# Altium footprint library PcbLib_ICs.PcbLib: 317 footprints (part 7 of 24) (continued)
## H02.8-1B [mm] (continued)
  text ".Designator" at -3.443,-0.467 h2
Top Text:
  lines w0.1: -0.5,0 0.5,0 ; 0,-0.5 0,0.5
3D body "User Library-H02_8-1B1.STEP": height 3.03, standoff -0.02, extent -4.5,-3.25 5,3.25

## H02.8-1B(with SO-8) [mm]
pads (18):
  rect 2.5x0.5 smd paste+0 mask+0.05: 1(-3.75,2) 2(-3.75,1) 3(-3.75,-1) 4(-3.75,-2) 5(3.75,-2) 6(3.75,-1) 7(3.75,1) 8(3.75,2) 9(-3.75,0) 10(3.75,0)
  rect 0.6x1.45 smd paste+0 mask+0.05: 1(1.905,2.725)
  oval 0.6x1.45 smd paste+0 mask+0.05: 2(0.635,2.725) 3(-0.635,2.725) 4(-1.905,2.725) 5(-1.905,-2.725) 6(-0.635,-2.725) 7(0.635,-2.725) 8(1.905,-2.725)
Top Overlay:
  circle w0.25: c-4.275,2.9 r0.125
  lines w0.2: -3.379,-3.372 -3.379,-2.625 ; -3.377,-3.372 -2.503,-3.372 ; -3.377,2.625 -3.377,3.372 -2.503,3.372 ; -1.375,3.375 -1.175,3.375 ; -1.365,-3.375 -1.165,-3.375 ; -0.105,3.375 0.095,3.375 ; -0.095,-3.375 0.105,-3.375 ; 1.165,3.375 1.365,3.375 ; 1.175,-3.375 1.375,-3.375 ; 2.503,-3.372 3.377,-3.372 3.377,-2.625 ; 2.503,3.372 3.377,3.372 ; 3.379,2.625 3.379,3.372
Top Simple Assy:
  circle w0.4: c-4.3,2.9 r0.05
Top Assy:
  circle w0.05: c1.784,1.225 r0.216
  lines w0.05: -2.451,-1.867 -2.451,1.867 ; -2.451,-1.867 -2.266,-1.682 ; -2.451,-1.867 2.451,-1.867 ; -2.451,-1.867 -2.451,1.867 ; -2.451,-1.867 -2.121,-1.867 ; -2.451,1.867 -2.266,1.682 ; -2.451,1.867 2.451,1.867 ; -2.451,1.867 -2.121,1.867 ; -2.266,-1.682 -2.266,1.682 ; -2.266,-1.682 2.266,-1.682 ; -2.266,1.682 2.266,1.682 ; -2.121,-2.889 -2.121,-2.502 ; -2.121,-2.889 -1.715,-2.889 ; -2.121,-2.889 -2.121,-1.867 ; -2.121,-2.889 -1.715,-2.889 ; -2.121,-2.502 -1.715,-2.502 ; -2.121,-2.502 -2.121,-2.261 ; -2.121,-2.261 -2.121,-2.019 ; -2.121,-2.261 -1.715,-2.261 ; -2.121,-2.019 -1.715,-2.019 ; -2.121,-2.019 -2.121,-1.867 ; -2.121,1.867 -2.121,2.019 ; -2.121,1.867 -2.121,2.889 ; -2.121,2.019 -1.715,2.019 ; -2.121,2.019 -2.121,2.261 ; -2.121,2.261 -2.121,2.502 ; -2.121,2.261 -1.715,2.261 ; -2.121,2.502 -1.715,2.502 ; -2.121,2.502 -2.121,2.889 ; -2.121,2.889 -1.715,2.889 ; -2.121,2.889 -1.715,2.889 ; -1.715,-2.889 -1.715,-2.502 ; -1.715,-2.889 -1.715,-1.867 ; -1.715,-2.502 -1.715,-2.261 ; -1.715,-2.261 -1.715,-2.019 ; -1.715,-2.019 -1.715,-1.867 ; -1.715,-1.867 -0.851,-1.867 ; -1.715,1.867 -1.715,2.019 ; -1.715,1.867 -0.851,1.867 ; -1.715,1.867 -1.715,2.889 ; -1.715,2.019 -1.715,2.261 ; -1.715,2.261 -1.715,2.502 ; -1.715,2.502 -1.715,2.889 ; -0.851,-2.889 -0.851,-2.502 ; -0.851,-2.889 -0.445,-2.889 ; -0.851,-2.889 -0.445,-2.889 ; -0.851,-2.889 -0.851,-1.867 ; -0.851,-2.502 -0.445,-2.502 ; -0.851,-2.502 -0.851,-2.261 ; -0.851,-2.261 -0.851,-2.019 ; -0.851,-2.261 -0.445,-2.261 ; -0.851,-2.019 -0.445,-2.019 ; -0.851,-2.019 -0.851,-1.867 ; -0.851,1.867 -0.851,2.019 ; -0.851,1.867 -0.851,2.889 ; -0.851,2.019 -0.445,2.019 ; -0.851,2.019 -0.851,2.261 ; -0.851,2.261 -0.851,2.502 ; -0.851,2.261 -0.445,2.261 ; -0.851,2.502 -0.445,2.502 ; -0.851,2.502 -0.851,2.889 ; -0.851,2.889 -0.445,2.889 ; -0.851,2.889 -0.445,2.889 ; -0.445,-2.889 -0.445,-2.502 ; -0.445,-2.889 -0.445,-1.867 ; -0.445,-2.502 -0.445,-2.261 ; -0.445,-2.261 -0.445,-2.019 ; -0.445,-2.019 -0.445,-1.867 ; -0.445,-1.867 0.419,-1.867 ; -0.445,1.867 -0.445,2.019 ; -0.445,1.867 0.419,1.867 ; -0.445,1.867 -0.445,2.889 ; -0.445,2.019 -0.445,2.261 ; -0.445,2.261 -0.445,2.502 ; -0.445,2.502 -0.445,2.889 ; 0.419,-2.889 0.419,-2.502 ; 0.419,-2.889 0.825,-2.889 ; 0.419,-2.889 0.419,-1.867 ; 0.419,-2.889 0.825,-2.889 ; 0.419,-2.502 0.825,-2.502 ; 0.419,-2.502 0.419,-2.261 ; 0.419,-2.261 0.419,-2.019 ; 0.419,-2.261 0.826,-2.261 ; 0.419,-2.019 0.826,-2.019 ; 0.419,-2.019 0.419,-1.867 ; 0.419,1.867 0.419,2.019 ; 0.419,1.867 0.419,2.889 ; 0.419,2.019 0.825,2.019 ; 0.419,2.019 0.419,2.261 ; 0.419,2.261 0.419,2.502 ; 0.419,2.261 0.826,2.261 ; 0.419,2.502 0.825,2.502 ; 0.419,2.502 0.419,2.889 ; 0.419,2.889 0.826,2.889 ; 0.419,2.889 0.826,2.889 ; 0.825,-2.889 0.825,-2.502 ; 0.825,-2.889 0.825,-1.867 ; 0.825,-2.502 0.826,-2.261 ; 0.826,-2.261 0.826,-2.019 ; 0.826,-2.019 0.825,-1.867 ; 0.825,-1.867 1.689,-1.867 ; 0.825,1.867 0.825,2.019 ; 0.825,1.867 1.689,1.867 ; 0.825,1.867 0.826,2.889 ; 0.825,2.019 0.826,2.261 ; 0.826,2.261 0.825,2.502 ; 0.825,2.502 0.826,2.889 ; 1.689,-2.889 1.689,-2.502 ; 1.689,-2.889 2.095,-2.889 ; 1.689,-2.889 2.095,-2.889 ; 1.689,-2.889 1.689,-1.867 ; 1.689,-2.502 2.095,-2.502 ; 1.689,-2.502 1.689,-2.261 ; 1.689,-2.261 1.689,-2.019 ; 1.689,-2.261 2.095,-2.261 ; 1.689,-2.019 2.095,-2.019 ; 1.689,-2.019 1.689,-1.867 ; 1.689,1.867 1.689,2.019 ; 1.689,1.867 1.689,2.889 ; 1.689,2.019 2.095,2.019 ; 1.689,2.019 1.689,2.261 ; 1.689,2.261 1.689,2.502 ; 1.689,2.261 2.095,2.261 ; 1.689,2.502 2.095,2.502 ; 1.689,2.502 1.689,2.889 ; 1.689,2.889 2.095,2.889 ; 1.689,2.889 2.095,2.889 ; 2.095,-2.889 2.095,-2.502 ; 2.095,-2.889 2.095,-1.867 ; 2.095,-2.502 2.095,-2.261 ; 2.095,-2.261 2.095,-2.019 ; 2.095,-2.019 2.095,-1.867 ; 2.095,-1.867 2.451,-1.867 ; 2.095,1.867 2.095,2.019 ; 2.095,1.867 2.451,1.867 ; 2.095,1.867 2.095,2.889 ; 2.095,2.019 2.095,2.261 ; 2.095,2.261 2.095,2.502 ; 2.095,2.502 2.095,2.889 ; 2.266,-1.682 2.266,1.682 ; 2.266,-1.682 2.451,-1.867 ; 2.266,1.682 2.451,1.867 ; 2.451,-1.867 2.451,1.867 ; 2.451,-1.867 2.451,1.867
  text ".Designator" at -3.443,-0.467 h2
Top Text:
  lines w0.1: -0.5,0 0.5,0 ; 0,-0.5 0,0.5
3D body "User Library-H02_8-1B1.STEP": height 3.03, standoff -0.02, extent -4.75,-3.25 4.75,3.25

## H04.16-2B [mm]
pads (16):
  rect 0.55x3.3 smd paste+0 mask+0.075: 1(0,0) 8(0,-9.1) 9(1,-9.1) 16(1,0)
  rect 3.3x0.55 smd paste+0 mask+0.075: 2(-3.85,-2.05) 3(-3.85,-3.05) 4(-3.85,-4.05) 5(-3.85,-5.05) 6(-3.85,-6.05) 7(-3.85,-7.05) 10(4.85,-7) 11(4.85,-6) 12(4.85,-5) 13(4.85,-4) 14(4.85,-3) 15(4.85,-2)
Top Overlay:
  circle w0.25: c-0.925,0.4 r0.125
  lines w0.2: -3.325,-7.975 -3.325,-8.575 -2.725,-8.575 ; -3.325,-1.125 -3.325,-0.525 -2.725,-0.525 ; 3.725,-8.575 4.325,-8.575 4.325,-7.975 ; 3.725,-0.525 4.325,-0.525 4.325,-1.125
Top Simple Assy:
  lines w0.05: -3.2,-8.45 -3.2,-0.65 4.2,-0.65 4.2,-8.45 -3.2,-8.45
3D body "�04.16-1� kirra.STEP": height 2.92, standoff 0, extent -7.34,-12.55 8.34,3.45

## H16.48-2B [mm]
pads (48):
  rect 1.6x0.5 smd paste+0 mask+0.075: 1(-7.4,-0.5) 2(-7.4,-1.5) 3(-7.4,-2.5) 4(-7.4,-3.5) 5(-7.4,-4.5) 6(-7.4,-5.5) 19(7.4,-5.5) 20(7.4,-4.5) 21(7.4,-3.5) 22(7.4,-2.5) 23(7.4,-1.5) 24(7.4,-0.5) 25(7.4,0.5) 26(7.4,1.5) 27(7.4,2.5) 28(7.4,3.5) 29(7.4,4.5) 30(7.4,5.5) 43(-7.4,5.5) 44(-7.4,4.5) 45(-7.4,3.5) 46(-7.4,2.5) 47(-7.4,1.5) 48(-7.4,0.5)
  rect 0.5x1.6 smd paste+0 mask+0.075: 7(-5.5,-7.4) 8(-4.5,-7.4) 9(-3.5,-7.4) 10(-2.5,-7.4) 11(-1.5,-7.4) 12(-0.5,-7.4) 13(0.5,-7.4) 14(1.5,-7.4) 15(2.5,-7.4) 16(3.5,-7.4) 17(4.5,-7.4) 18(5.5,-7.4) 31(5.5,7.4) 32(4.5,7.4) 33(3.5,7.4) 34(2.5,7.4) 35(1.5,7.4) 36(0.5,7.4) 37(-0.5,7.4) 38(-1.5,7.4) 39(-2.5,7.4) 40(-3.5,7.4) 41(-4.5,7.4) 42(-5.5,7.4)
Top Overlay:
  circle w0.25: c-9,-0.5 r0.125
  region: -1.5,0 -1,0.5 1.5,0.5 1.5,-0.5 -1,-0.5
  lines w0.2: -7.2,-6.6 -7.2,-7.2 -6.6,-7.2 ; -7.2,6.6 -7.2,7.2 -6.6,7.2 ; 6.6,-7.2 7.2,-7.2 7.2,-6.6 ; 6.6,7.2 7.2,7.2 7.2,6.6
Top Simple Assy:
  lines w0.05: -8.1,-8.1 8.1,-8.1 8.1,8.1 -8.1,8.1 -8.1,-8.1
Top Assy:
  drawing of 192 lines, arcs and shapes, not listed
  text ".Designator" at -3.443,-0.467 h2
Top Text:
  lines w0.1: -0.5,0 0.5,0 ; 0,-0.5 0,0.5
3D body "H16.48-2B.STEP": height 2.99, standoff -0.01, extent -8.1,-8.1 8.1,8.1

## H18.64-1B [mm]
pads (64):
  rect 2.5x0.6 smd paste+0 mask+0.075: 1(-12,-0.5)
  rect 2x0.6 smd paste+0 mask+0.075: 2(-11.75,-1.5) 3(-11.75,-2.5) 4(-11.75,-3.5) 5(-11.75,-4.5) 6(-11.75,-5.5) 7(-11.75,-6.5) 8(-11.75,-7.5) 25(11.75,-7.5) 26(11.75,-6.5) 27(11.75,-5.5) 28(11.75,-4.5) 29(11.75,-3.5) 30(11.75,-2.5) 31(11.75,-1.5) 32(11.75,-0.5) 33(11.75,0.5) 34(11.75,1.5) 35(11.75,2.5) 36(11.75,3.5) 37(11.75,4.5) 38(11.75,5.5) 39(11.75,6.5) 40(11.75,7.5) 57(-11.75,7.5) 58(-11.75,6.5) 59(-11.75,5.5) 60(-11.75,4.5) 61(-11.75,3.5) 62(-11.75,2.5) 63(-11.75,1.5) 64(-11.75,0.5)
  rect 0.6x2 smd paste+0 mask+0.075: 9(-7.5,-11.75) 10(-6.5,-11.75) 11(-5.5,-11.75) 12(-4.5,-11.75) 13(-3.5,-11.75) 14(-2.5,-11.75) 15(-1.5,-11.75) 16(-0.5,-11.75) 17(0.5,-11.75) 18(1.5,-11.75) 19(2.5,-11.75) 20(3.5,-11.75) 21(4.5,-11.75) 22(5.5,-11.75) 23(6.5,-11.75) 24(7.5,-11.75) 41(7.5,11.75) 42(6.5,11.75) 43(5.5,11.75) 44(4.5,11.75) 45(3.5,11.75) 46(2.5,11.75) 47(1.5,11.75) 48(0.5,11.75) 49(-0.5,11.75) 50(-1.5,11.75) 51(-2.5,11.75) 52(-3.5,11.75) 53(-4.5,11.75) 54(-5.5,11.75) 55(-6.5,11.75) 56(-7.5,11.75)
Top Overlay:
  circle w0.25: c-14,-0.5 r0.125
  region: -1.5,0 -1,0.5 1.5,0.5 1.5,-0.5 -1,-0.5
  lines w0.2: -9.35,-8.75 -9.35,-9.35 -8.75,-9.35 ; -9.35,8.75 -9.35,9.35 -8.75,9.35 ; 8.75,-9.35 9.35,-9.35 9.35,-8.75 ; 8.75,9.35 9.35,9.35 9.35,8.75
Top Simple Assy:
  lines w0.05: -8.1,-8.1 8.1,-8.1 8.1,8.1 -8.1,8.1 -8.1,-8.1
Top Assy:
  drawing of 490 lines, arcs and shapes, not listed
  text ".Designator" at -3.443,-0.467 h2
Top Text:
  lines w0.1: -0.5,0 0.5,0 ; 0,-0.5 0,0.5
3D body "H18_64-1B.x_t": height 2.51, standoff 0, extent -12.15,-12.15 12.15,12.15

## H18.64-1B(WITH LQFP-64) [mm]
pads (128):
  rect 2x0.6 smd paste+0 mask+0.075: 1(-11.75,-3.5) 10(-11.75,-1.5) 11(-11.75,-2.5) 12(11.75,-3.5) 13(-11.75,-4.5) 14(-11.75,-5.5) 25(11.75,-7.5) 26(11.75,-6.5) 27(11.75,-5.5) 28(11.75,-4.5) 37(11.75,-0.5) 38(11.75,7.5) 39(11.75,-2.5) 40(11.75,-1.5) 42(11.75,1.5) 43(11.75,2.5) 44(11.75,3.5) 45(11.75,4.5) 46(11.75,5.5) 47(11.75,6.5) 48(-11.75,7.5) 49(11.75,0.5) 58(-11.75,6.5) 59(-11.75,5.5) 60(-11.75,4.5) 61(-11.75,3.5) 62(-11.75,2.5) 63(-11.75,-6.5) 63(-11.75,1.5) 64(-11.75,-7.5) 64(-11.75,0.5)
  rect 0.6x2 smd paste+0 mask+0.075: 1(-6.5,-11.75) 13(-3.5,-11.75) 14(-2.5,-11.75) 17(-7.5,-11.75) 17(0.5,-11.75) 18(1.5,-11.75) 19(-5.5,-11.75) 20(-4.5,-11.75) 21(4.5,-11.75) 22(5.5,-11.75) 23(-1.5,-11.75) 23(6.5,-11.75) 24(-0.5,-11.75) 24(7.5,-11.75) 27(2.5,-11.75) 28(3.5,-11.75) 41(7.5,11.75) 50(6.5,11.75) 51(5.5,11.75) 52(4.5,11.75) 53(3.5,11.75) 54(2.5,11.75) 55(1.5,11.75) 56(0.5,11.75) 57(-0.5,11.75) 58(-1.5,11.75) 59(-2.5,11.75) 60(-3.5,11.75) 61(-4.5,11.75) 62(-5.5,11.75) 63(-6.5,11.75) 64(-7.5,11.75)
  rect 1.45x0.3 smd paste+0 mask+0.05: 1(-5.725,3.75)
  oval 1.45x0.3 smd paste+0 mask+0.05: 2(-5.725,3.25) 3(-5.725,2.75) 4(-5.725,2.25) 5(-5.725,1.75) 6(-5.725,1.25) 7(-5.725,0.75) 8(-5.725,0.25) 9(-5.725,-0.25) 10(-5.725,-0.75) 11(-5.725,-1.25) 12(-5.725,-1.75) 13(-5.725,-2.25) 14(-5.725,-2.75) 15(-5.725,-3.25) 16(-5.725,-3.75) 33(5.725,-3.75) 34(5.725,-3.25) 35(5.725,-2.75) 36(5.725,-2.25) 37(5.725,-1.75) 38(5.725,-1.25) 39(5.725,-0.75) 40(5.725,-0.25) 41(5.725,0.25) 42(5.725,0.75) 43(5.725,1.25) 44(5.725,1.75) 45(5.725,2.25) 46(5.725,2.75) 47(5.725,3.25) 48(5.725,3.75)
  rect 2.5x0.6 smd paste+0 mask+0.075: 9(-12,-0.5)
  oval 0.3x1.45 smd paste+0 mask+0.05: 17(-3.75,-5.725) 18(-3.25,-5.725) 19(-2.75,-5.725) 20(-2.25,-5.725) 21(-1.75,-5.725) 22(-1.25,-5.725) 23(-0.75,-5.725) 24(-0.25,-5.725) 25(0.25,-5.725) 26(0.75,-5.725) 27(1.25,-5.725) 28(1.75,-5.725) 29(2.25,-5.725) 30(2.75,-5.725) 31(3.25,-5.725) 32(3.75,-5.725) 49(3.75,5.725) 50(3.25,5.725) 51(2.75,5.725) 52(2.25,5.725) 53(1.75,5.725) 54(1.25,5.725) 55(0.75,5.725) 56(0.25,5.725) 57(-0.25,5.725) 58(-0.75,5.725) 59(-1.25,5.725) 60(-1.75,5.725) 61(-2.25,5.725) 62(-2.75,5.725) 63(-3.25,5.725) 64(-3.75,5.725)
Top Overlay:
  circle w0.25: c-14,-0.5 r0.125
  circle w0.25: c-6.125,4.5 r0.125
  region: -1.5,0 -1,0.5 1.5,0.5 1.5,-0.5 -1,-0.5
  lines w0.2: -9.35,-8.75 -9.35,-9.35 -8.75,-9.35 ; -9.35,8.75 -9.35,9.35 -8.75,9.35 ; -7.75,-3.75 -6.75,-3.75 ; -7.75,0.25 -6.75,0.25 ; -7.75,3.75 -6.75,3.75 ; -5.25,-4.25 -5.25,-5.25 -4.25,-5.25 ; -5.25,4.25 -5.25,5.25 -4.25,5.25 ; -3.75,-7.75 -3.75,-6.75 ; -3.75,6.75 -3.75,7.75 ; -0.25,-7.75 -0.25,-6.75 ; 0.25,6.75 0.25,7.75 ; 3.75,-7.75 3.75,-6.75 ; 3.75,6.75 3.75,7.75 ; 4.25,-5.25 5.25,-5.25 5.25,-4.25 ; 4.25,5.25 5.25,5.25 5.25,4.25 ; 6.75,-3.75 7.75,-3.75 ; 6.75,-0.25 7.75,-0.25 ; 6.75,3.75 7.75,3.75 ; 8.75,-9.35 9.35,-9.35 9.35,-8.75 ; 8.75,9.35 9.35,9.35 9.35,8.75
Top Simple Assy:
  lines w0.05: -8.1,-8.1 8.1,-8.1 8.1,8.1 -8.1,8.1 -8.1,-8.1
Top Assy:
  drawing of 2585 lines, arcs and shapes, not listed
  text ".Designator" at -3.443,-0.467 h2
Top Text:
  lines w0.05: -13.5,-13.5 -13.5,13.5 13.5,13.5 13.5,-13.5 -13.5,-13.5
  lines w0.1: -0.5,0 0.5,0 ; 0,-0.5 0,0.5
3D body "User Library-LQFP64-1_0.5mm_pitch.step": height 1.56, standoff 0, extent -6,-6 6,6

## HBGA-780 [mm] "BGA, 780-Balls, Body 33x33mm, Pitch 1mm"
height 3.6
pads (780):
  round 0.5 smd paste+0 mask+0.05: A2(-12.5,13.5) A3(-11.5,13.5) A4(-10.5,13.5) A5(-9.5,13.5) A6(-8.5,13.5) A7(-7.5,13.5) A8(-6.5,13.5) A9(-5.5,13.5) A10(-4.5,13.5) A11(-3.5,13.5) A12(-2.5,13.5) A13(-1.5,13.5) A14(-0.5,13.5) A15(0.5,13.5) A16(1.5,13.5) A17(2.5,13.5) A18(3.5,13.5) A19(4.5,13.5) A20(5.5,13.5) A21(6.5,13.5) A22(7.5,13.5) A23(8.5,13.5) A24(9.5,13.5) A25(10.5,13.5) A26(11.5,13.5) A27(12.5,13.5) AA1(-13.5,-6.5) AA2(-12.5,-6.5) AA3(-11.5,-6.5) AA4(-10.5,-6.5) AA5(-9.5,-6.5) AA6(-8.5,-6.5) AA7(-7.5,-6.5) AA8(-6.5,-6.5) AA9(-5.5,-6.5) AA10(-4.5,-6.5) AA11(-3.5,-6.5) AA12(-2.5,-6.5) AA13(-1.5,-6.5) AA14(-0.5,-6.5) AA15(0.5,-6.5) AA16(1.5,-6.5) AA17(2.5,-6.5) AA18(3.5,-6.5) AA19(4.5,-6.5) AA20(5.5,-6.5) AA21(6.5,-6.5) AA22(7.5,-6.5) AA23(8.5,-6.5) AA24(9.5,-6.5) AA25(10.5,-6.5) AA26(11.5,-6.5) AA27(12.5,-6.5) AA28(13.5,-6.5) AB1(-13.5,-7.5) AB2(-12.5,-7.5) AB3(-11.5,-7.5) AB4(-10.5,-7.5) AB5(-9.5,-7.5) AB6(-8.5,-7.5) AB7(-7.5,-7.5) AB8(-6.5,-7.5) AB9(-5.5,-7.5) AB10(-4.5,-7.5) AB11(-3.5,-7.5) AB12(-2.5,-7.5) AB13(-1.5,-7.5) AB14(-0.5,-7.5) AB15(0.5,-7.5) AB16(1.5,-7.5) AB17(2.5,-7.5) AB18(3.5,-7.5) AB19(4.5,-7.5) AB20(5.5,-7.5) AB21(6.5,-7.5) AB22(7.5,-7.5) AB23(8.5,-7.5) AB24(9.5,-7.5) AB25(10.5,-7.5) AB26(11.5,-7.5) AB27(12.5,-7.5) AB28(13.5,-7.5) AC1(-13.5,-8.5) AC2(-12.5,-8.5) AC3(-11.5,-8.5) AC4(-10.5,-8.5) AC5(-9.5,-8.5) AC6(-8.5,-8.5) AC7(-7.5,-8.5) AC8(-6.5,-8.5) AC9(-5.5,-8.5) AC10(-4.5,-8.5) AC11(-3.5,-8.5) AC12(-2.5,-8.5) AC13(-1.5,-8.5) AC14(-0.5,-8.5) AC15(0.5,-8.5) AC16(1.5,-8.5) AC17(2.5,-8.5) AC18(3.5,-8.5) AC19(4.5,-8.5) AC20(5.5,-8.5) AC21(6.5,-8.5) AC22(7.5,-8.5) AC23(8.5,-8.5) AC24(9.5,-8.5) AC25(10.5,-8.5) AC26(11.5,-8.5) AC27(12.5,-8.5) AC28(13.5,-8.5) AD1(-13.5,-9.5) AD2(-12.5,-9.5) AD3(-11.5,-9.5) AD4(-10.5,-9.5) AD5(-9.5,-9.5) AD6(-8.5,-9.5) AD7(-7.5,-9.5) AD8(-6.5,-9.5) AD9(-5.5,-9.5) AD10(-4.5,-9.5) AD11(-3.5,-9.5) AD12(-2.5,-9.5) AD13(-1.5,-9.5) AD14(-0.5,-9.5) AD15(0.5,-9.5) AD16(1.5,-9.5) AD17(2.5,-9.5) AD18(3.5,-9.5) AD19(4.5,-9.5) AD20(5.5,-9.5) AD21(6.5,-9.5) AD22(7.5,-9.5) AD23(8.5,-9.5) AD24(9.5,-9.5) AD25(10.5,-9.5) AD26(11.5,-9.5) AD27(12.5,-9.5) AD28(13.5,-9.5) AE1(-13.5,-10.5) AE2(-12.5,-10.5) AE3(-11.5,-10.5) AE4(-10.5,-10.5) AE5(-9.5,-10.5) AE6(-8.5,-10.5) AE7(-7.5,-10.5) AE8(-6.5,-10.5) AE9(-5.5,-10.5) AE10(-4.5,-10.5) AE11(-3.5,-10.5) AE12(-2.5,-10.5) AE13(-1.5,-10.5) AE14(-0.5,-10.5) AE15(0.5,-10.5) AE16(1.5,-10.5) AE17(2.5,-10.5) AE18(3.5,-10.5) AE19(4.5,-10.5) AE20(5.5,-10.5) AE21(6.5,-10.5) AE22(7.5,-10.5) AE23(8.5,-10.5) AE24(9.5,-10.5) AE25(10.5,-10.5) AE26(11.5,-10.5) AE27(12.5,-10.5) AE28(13.5,-10.5) AF1(-13.5,-11.5) AF2(-12.5,-11.5) AF3(-11.5,-11.5) AF4(-10.5,-11.5) AF5(-9.5,-11.5) AF6(-8.5,-11.5) AF7(-7.5,-11.5) AF8(-6.5,-11.5) AF9(-5.5,-11.5) AF10(-4.5,-11.5) AF11(-3.5,-11.5) AF12(-2.5,-11.5) AF13(-1.5,-11.5) AF14(-0.5,-11.5) AF15(0.5,-11.5) AF16(1.5,-11.5) AF17(2.5,-11.5) AF18(3.5,-11.5) AF19(4.5,-11.5) AF20(5.5,-11.5) AF21(6.5,-11.5) AF22(7.5,-11.5) AF23(8.5,-11.5) AF24(9.5,-11.5) AF25(10.5,-11.5) AF26(11.5,-11.5) AF27(12.5,-11.5) AF28(13.5,-11.5) AG1(-13.5,-12.5) AG2(-12.5,-12.5) AG3(-11.5,-12.5) AG4(-10.5,-12.5) AG5(-9.5,-12.5) AG6(-8.5,-12.5) AG7(-7.5,-12.5) AG8(-6.5,-12.5) AG9(-5.5,-12.5) AG10(-4.5,-12.5) AG11(-3.5,-12.5) AG12(-2.5,-12.5) AG13(-1.5,-12.5) AG14(-0.5,-12.5) AG15(0.5,-12.5) AG16(1.5,-12.5) AG17(2.5,-12.5) AG18(3.5,-12.5) AG19(4.5,-12.5) AG20(5.5,-12.5) AG21(6.5,-12.5) AG22(7.5,-12.5) AG23(8.5,-12.5) AG24(9.5,-12.5) AG25(10.5,-12.5) AG26(11.5,-12.5) AG27(12.5,-12.5) AG28(13.5,-12.5) AH2(-12.5,-13.5) AH3(-11.5,-13.5) AH4(-10.5,-13.5) AH5(-9.5,-13.5) AH6(-8.5,-13.5) AH7(-7.5,-13.5) AH8(-6.5,-13.5) AH9(-5.5,-13.5) AH10(-4.5,-13.5) AH11(-3.5,-13.5) AH12(-2.5,-13.5) AH13(-1.5,-13.5) AH14(-0.5,-13.5) AH15(0.5,-13.5) AH16(1.5,-13.5) AH17(2.5,-13.5) AH18(3.5,-13.5) AH19(4.5,-13.5) AH20(5.5,-13.5) AH21(6.5,-13.5) AH22(7.5,-13.5) AH23(8.5,-13.5) AH24(9.5,-13.5) AH25(10.5,-13.5) AH26(11.5,-13.5) AH27(12.5,-13.5) B1(-13.5,12.5) B2(-12.5,12.5) B3(-11.5,12.5) B4(-10.5,12.5) B5(-9.5,12.5) B6(-8.5,12.5) B7(-7.5,12.5) B8(-6.5,12.5) B9(-5.5,12.5) B10(-4.5,12.5) B11(-3.5,12.5) B12(-2.5,12.5) B13(-1.5,12.5) B14(-0.5,12.5) B15(0.5,12.5) B16(1.5,12.5) B17(2.5,12.5) B18(3.5,12.5) B19(4.5,12.5) B20(5.5,12.5) B21(6.5,12.5) B22(7.5,12.5) B23(8.5,12.5) B24(9.5,12.5) B25(10.5,12.5) B26(11.5,12.5) B27(12.5,12.5) B28(13.5,12.5) C1(-13.5,11.5) C2(-12.5,11.5) C3(-11.5,11.5) C4(-10.5,11.5) C5(-9.5,11.5) C6(-8.5,11.5) C7(-7.5,11.5) C8(-6.5,11.5) C9(-5.5,11.5) C10(-4.5,11.5) C11(-3.5,11.5) C12(-2.5,11.5) C13(-1.5,11.5) C14(-0.5,11.5) C15(0.5,11.5) C16(1.5,11.5) C17(2.5,11.5) C18(3.5,11.5) C19(4.5,11.5) C20(5.5,11.5) C21(6.5,11.5) C22(7.5,11.5) C23(8.5,11.5) C24(9.5,11.5) C25(10.5,11.5) C26(11.5,11.5) C27(12.5,11.5) C28(13.5,11.5) D1(-13.5,10.5) D2(-12.5,10.5) D3(-11.5,10.5) D4(-10.5,10.5) D5(-9.5,10.5) D6(-8.5,10.5) D7(-7.5,10.5) D8(-6.5,10.5) D9(-5.5,10.5) D10(-4.5,10.5) D11(-3.5,10.5) D12(-2.5,10.5) D13(-1.5,10.5) D14(-0.5,10.5) D15(0.5,10.5) D16(1.5,10.5) D17(2.5,10.5) D18(3.5,10.5) D19(4.5,10.5) D20(5.5,10.5) D21(6.5,10.5) D22(7.5,10.5) D23(8.5,10.5) D24(9.5,10.5) D25(10.5,10.5) D26(11.5,10.5) D27(12.5,10.5) D28(13.5,10.5) E1(-13.5,9.5) E2(-12.5,9.5) E3(-11.5,9.5) E4(-10.5,9.5) E5(-9.5,9.5) E6(-8.5,9.5) E7(-7.5,9.5) E8(-6.5,9.5) E9(-5.5,9.5) E10(-4.5,9.5) E11(-3.5,9.5) E12(-2.5,9.5) E13(-1.5,9.5) E14(-0.5,9.5) E15(0.5,9.5) E16(1.5,9.5) E17(2.5,9.5) E18(3.5,9.5) E19(4.5,9.5) E20(5.5,9.5) E21(6.5,9.5) E22(7.5,9.5) E23(8.5,9.5) E24(9.5,9.5) E25(10.5,9.5) E26(11.5,9.5) E27(12.5,9.5) E28(13.5,9.5) F1(-13.5,8.5) F2(-12.5,8.5) F3(-11.5,8.5) F4(-10.5,8.5) F5(-9.5,8.5) F6(-8.5,8.5) F7(-7.5,8.5) F8(-6.5,8.5) F9(-5.5,8.5) F10(-4.5,8.5) F11(-3.5,8.5) F12(-2.5,8.5) F13(-1.5,8.5) F14(-0.5,8.5) F15(0.5,8.5) F16(1.5,8.5) F17(2.5,8.5) F18(3.5,8.5) F19(4.5,8.5) F20(5.5,8.5) F21(6.5,8.5) F22(7.5,8.5) F23(8.5,8.5) F24(9.5,8.5) F25(10.5,8.5) F26(11.5,8.5) F27(12.5,8.5) F28(13.5,8.5) G1(-13.5,7.5) G2(-12.5,7.5) G3(-11.5,7.5) G4(-10.5,7.5) G5(-9.5,7.5) G6(-8.5,7.5) G7(-7.5,7.5) G8(-6.5,7.5) G9(-5.5,7.5) G10(-4.5,7.5) G11(-3.5,7.5) G12(-2.5,7.5) G13(-1.5,7.5) G14(-0.5,7.5) G15(0.5,7.5) G16(1.5,7.5) G17(2.5,7.5) G18(3.5,7.5) G19(4.5,7.5) G20(5.5,7.5) G21(6.5,7.5) G22(7.5,7.5) G23(8.5,7.5) G24(9.5,7.5) G25(10.5,7.5) G26(11.5,7.5) G27(12.5,7.5) G28(13.5,7.5) H1(-13.5,6.5) H2(-12.5,6.5) H3(-11.5,6.5) H4(-10.5,6.5) H5(-9.5,6.5) H6(-8.5,6.5) H7(-7.5,6.5) H8(-6.5,6.5) H9(-5.5,6.5) H10(-4.5,6.5) H11(-3.5,6.5) H12(-2.5,6.5) H13(-1.5,6.5) H14(-0.5,6.5) H15(0.5,6.5) H16(1.5,6.5) H17(2.5,6.5) H18(3.5,6.5) H19(4.5,6.5) H20(5.5,6.5) H21(6.5,6.5) H22(7.5,6.5) H23(8.5,6.5) H24(9.5,6.5) H25(10.5,6.5) H26(11.5,6.5) H27(12.5,6.5) H28(13.5,6.5) J1(-13.5,5.5) J2(-12.5,5.5) J3(-11.5,5.5) J4(-10.5,5.5) J5(-9.5,5.5) J6(-8.5,5.5) J7(-7.5,5.5) J8(-6.5,5.5) J9(-5.5,5.5) J10(-4.5,5.5) J11(-3.5,5.5) J12(-2.5,5.5) J13(-1.5,5.5) J14(-0.5,5.5) J15(0.5,5.5) J16(1.5,5.5) J17(2.5,5.5) J18(3.5,5.5) J19(4.5,5.5) J20(5.5,5.5) J21(6.5,5.5) J22(7.5,5.5) J23(8.5,5.5) J24(9.5,5.5) J25(10.5,5.5) J26(11.5,5.5) J27(12.5,5.5) J28(13.5,5.5) K1(-13.5,4.5) K2(-12.5,4.5) K3(-11.5,4.5) K4(-10.5,4.5) K5(-9.5,4.5) K6(-8.5,4.5) K7(-7.5,4.5) K8(-6.5,4.5) K9(-5.5,4.5) K10(-4.5,4.5) K11(-3.5,4.5) K12(-2.5,4.5) K13(-1.5,4.5) K14(-0.5,4.5) K15(0.5,4.5) K16(1.5,4.5) K17(2.5,4.5) K18(3.5,4.5) K19(4.5,4.5) K20(5.5,4.5) K21(6.5,4.5) K22(7.5,4.5) K23(8.5,4.5) K24(9.5,4.5) K25(10.5,4.5) K26(11.5,4.5) K27(12.5,4.5) K28(13.5,4.5) L1(-13.5,3.5) L2(-12.5,3.5) L3(-11.5,3.5) L4(-10.5,3.5) L5(-9.5,3.5) L6(-8.5,3.5) L7(-7.5,3.5) L8(-6.5,3.5) L9(-5.5,3.5) L10(-4.5,3.5) L11(-3.5,3.5) L12(-2.5,3.5) L13(-1.5,3.5) L14(-0.5,3.5) L15(0.5,3.5) L16(1.5,3.5) L17(2.5,3.5) L18(3.5,3.5) L19(4.5,3.5) L20(5.5,3.5) L21(6.5,3.5) L22(7.5,3.5) L23(8.5,3.5) L24(9.5,3.5) L25(10.5,3.5) L26(11.5,3.5) L27(12.5,3.5) L28(13.5,3.5) M1(-13.5,2.5) M2(-12.5,2.5) M3(-11.5,2.5) M4(-10.5,2.5) M5(-9.5,2.5) M6(-8.5,2.5) M7(-7.5,2.5) M8(-6.5,2.5) M9(-5.5,2.5) M10(-4.5,2.5) M11(-3.5,2.5) M12(-2.5,2.5) M13(-1.5,2.5) M14(-0.5,2.5) M15(0.5,2.5) M16(1.5,2.5) M17(2.5,2.5) M18(3.5,2.5) M19(4.5,2.5) M20(5.5,2.5) M21(6.5,2.5) M22(7.5,2.5) M23(8.5,2.5) M24(9.5,2.5) M25(10.5,2.5) M26(11.5,2.5) M27(12.5,2.5) M28(13.5,2.5) N1(-13.5,1.5) N2(-12.5,1.5) N3(-11.5,1.5) N4(-10.5,1.5) N5(-9.5,1.5) N6(-8.5,1.5) N7(-7.5,1.5) N8(-6.5,1.5) N9(-5.5,1.5) N10(-4.5,1.5) N11(-3.5,1.5) N12(-2.5,1.5) N13(-1.5,1.5) N14(-0.5,1.5) N15(0.5,1.5) N16(1.5,1.5) N17(2.5,1.5) N18(3.5,1.5) N19(4.5,1.5) N20(5.5,1.5) N21(6.5,1.5) N22(7.5,1.5) N23(8.5,1.5) N24(9.5,1.5) N25(10.5,1.5) N26(11.5,1.5) N27(12.5,1.5) N28(13.5,1.5) P1(-13.5,0.5) P2(-12.5,0.5) P3(-11.5,0.5) P4(-10.5,0.5) P5(-9.5,0.5) P6(-8.5,0.5) P7(-7.5,0.5) P8(-6.5,0.5) P9(-5.5,0.5) P10(-4.5,0.5) P11(-3.5,0.5) P12(-2.5,0.5) P13(-1.5,0.5) P14(-0.5,0.5) P15(0.5,0.5) P16(1.5,0.5) P17(2.5,0.5) P18(3.5,0.5) P19(4.5,0.5) P20(5.5,0.5) P21(6.5,0.5) P22(7.5,0.5) P23(8.5,0.5) P24(9.5,0.5) P25(10.5,0.5) P26(11.5,0.5) P27(12.5,0.5) P28(13.5,0.5) R1(-13.5,-0.5) R2(-12.5,-0.5) R3(-11.5,-0.5) R4(-10.5,-0.5) R5(-9.5,-0.5) R6(-8.5,-0.5) R7(-7.5,-0.5) R8(-6.5,-0.5) R9(-5.5,-0.5) R10(-4.5,-0.5) R11(-3.5,-0.5) R12(-2.5,-0.5) R13(-1.5,-0.5) R14(-0.5,-0.5) R15(0.5,-0.5) R16(1.5,-0.5) R17(2.5,-0.5) R18(3.5,-0.5) R19(4.5,-0.5) R20(5.5,-0.5) R21(6.5,-0.5) R22(7.5,-0.5) R23(8.5,-0.5) R24(9.5,-0.5) R25(10.5,-0.5) R26(11.5,-0.5) R27(12.5,-0.5) R28(13.5,-0.5) T1(-13.5,-1.5) T2(-12.5,-1.5) T3(-11.5,-1.5) T4(-10.5,-1.5) T5(-9.5,-1.5) T6(-8.5,-1.5) T7(-7.5,-1.5) T8(-6.5,-1.5) T9(-5.5,-1.5) T10(-4.5,-1.5) T11(-3.5,-1.5) T12(-2.5,-1.5) T13(-1.5,-1.5) T14(-0.5,-1.5) T15(0.5,-1.5) T16(1.5,-1.5) T17(2.5,-1.5) T18(3.5,-1.5) T19(4.5,-1.5) T20(5.5,-1.5) T21(6.5,-1.5) T22(7.5,-1.5) T23(8.5,-1.5) T24(9.5,-1.5) T25(10.5,-1.5) T26(11.5,-1.5) T27(12.5,-1.5) T28(13.5,-1.5) U1(-13.5,-2.5) U2(-12.5,-2.5) U3(-11.5,-2.5) U4(-10.5,-2.5) U5(-9.5,-2.5) U6(-8.5,-2.5) U7(-7.5,-2.5) U8(-6.5,-2.5) U9(-5.5,-2.5) U10(-4.5,-2.5) U11(-3.5,-2.5) U12(-2.5,-2.5) U13(-1.5,-2.5) U14(-0.5,-2.5) U15(0.5,-2.5) U16(1.5,-2.5) U17(2.5,-2.5) U18(3.5,-2.5) U19(4.5,-2.5) U20(5.5,-2.5) U21(6.5,-2.5) U22(7.5,-2.5) U23(8.5,-2.5) U24(9.5,-2.5) U25(10.5,-2.5) U26(11.5,-2.5) U27(12.5,-2.5) U28(13.5,-2.5) V1(-13.5,-3.5) V2(-12.5,-3.5) V3(-11.5,-3.5) V4(-10.5,-3.5) V5(-9.5,-3.5) V6(-8.5,-3.5) V7(-7.5,-3.5) V8(-6.5,-3.5) V9(-5.5,-3.5) V10(-4.5,-3.5) V11(-3.5,-3.5) V12(-2.5,-3.5) V13(-1.5,-3.5) V14(-0.5,-3.5) V15(0.5,-3.5) V16(1.5,-3.5) V17(2.5,-3.5) V18(3.5,-3.5) V19(4.5,-3.5) V20(5.5,-3.5) V21(6.5,-3.5) V22(7.5,-3.5) V23(8.5,-3.5) V24(9.5,-3.5) V25(10.5,-3.5) V26(11.5,-3.5) V27(12.5,-3.5) V28(13.5,-3.5) W1(-13.5,-4.5) W2(-12.5,-4.5) W3(-11.5,-4.5) W4(-10.5,-4.5) W5(-9.5,-4.5) W6(-8.5,-4.5) W7(-7.5,-4.5) W8(-6.5,-4.5) W9(-5.5,-4.5) W10(-4.5,-4.5) W11(-3.5,-4.5) W12(-2.5,-4.5) W13(-1.5,-4.5) W14(-0.5,-4.5) W15(0.5,-4.5) W16(1.5,-4.5) W17(2.5,-4.5) W18(3.5,-4.5) W19(4.5,-4.5) W20(5.5,-4.5) W21(6.5,-4.5) W22(7.5,-4.5) W23(8.5,-4.5) W24(9.5,-4.5) W25(10.5,-4.5) W26(11.5,-4.5) W27(12.5,-4.5) W28(13.5,-4.5) Y1(-13.5,-5.5) Y2(-12.5,-5.5) Y3(-11.5,-5.5) Y4(-10.5,-5.5) Y5(-9.5,-5.5) Y6(-8.5,-5.5) Y7(-7.5,-5.5) Y8(-6.5,-5.5) Y9(-5.5,-5.5) Y10(-4.5,-5.5) Y11(-3.5,-5.5) Y12(-2.5,-5.5) Y13(-1.5,-5.5) Y14(-0.5,-5.5) Y15(0.5,-5.5) Y16(1.5,-5.5) Y17(2.5,-5.5) Y18(3.5,-5.5) Y19(4.5,-5.5) Y20(5.5,-5.5) Y21(6.5,-5.5) Y22(7.5,-5.5) Y23(8.5,-5.5) Y24(9.5,-5.5) Y25(10.5,-5.5) Y26(11.5,-5.5) Y27(12.5,-5.5) Y28(13.5,-5.5)
Top Overlay:
  circle w0.25: c-17.15,16.35 r0.125
  region: -15.5,16.5 -16.5,15.5 -16.5,16.5
  lines w0.2: -16.5,15.5 -15.5,16.5 ; -16.5,-16.5 16.5,-16.5 16.5,16.5 -16.5,16.5 -16.5,-16.5
Top Assy:
  lines w0.1: -16.5,-16.5 16.5,-16.5 16.5,16.5 -16.5,16.5 -16.5,-16.5
Top Text:
  lines w0.05: -17,-17 17,-17 17,17 -17,17 -17,-17
  lines w0.1: -0.5,0 0.5,0 ; 0,-0.5 0,0.5
3D body: height 3.6, standoff 0.4, extent -16.5,-16.5 16.5,16.5